# Altium footprint library GyokuRe.PcbLib: 1248 footprints (part 46 of 78)
Each footprint in its own frame and in the unit in brackets; x right, y up, seen from the top. Pads: shape width x height; smd on the part's side, far side on the other; paste and mask are expansions set on the pad; w line width, h text height; cw(c..) or ccw(c..) is an arc to the next point about the centre after c.
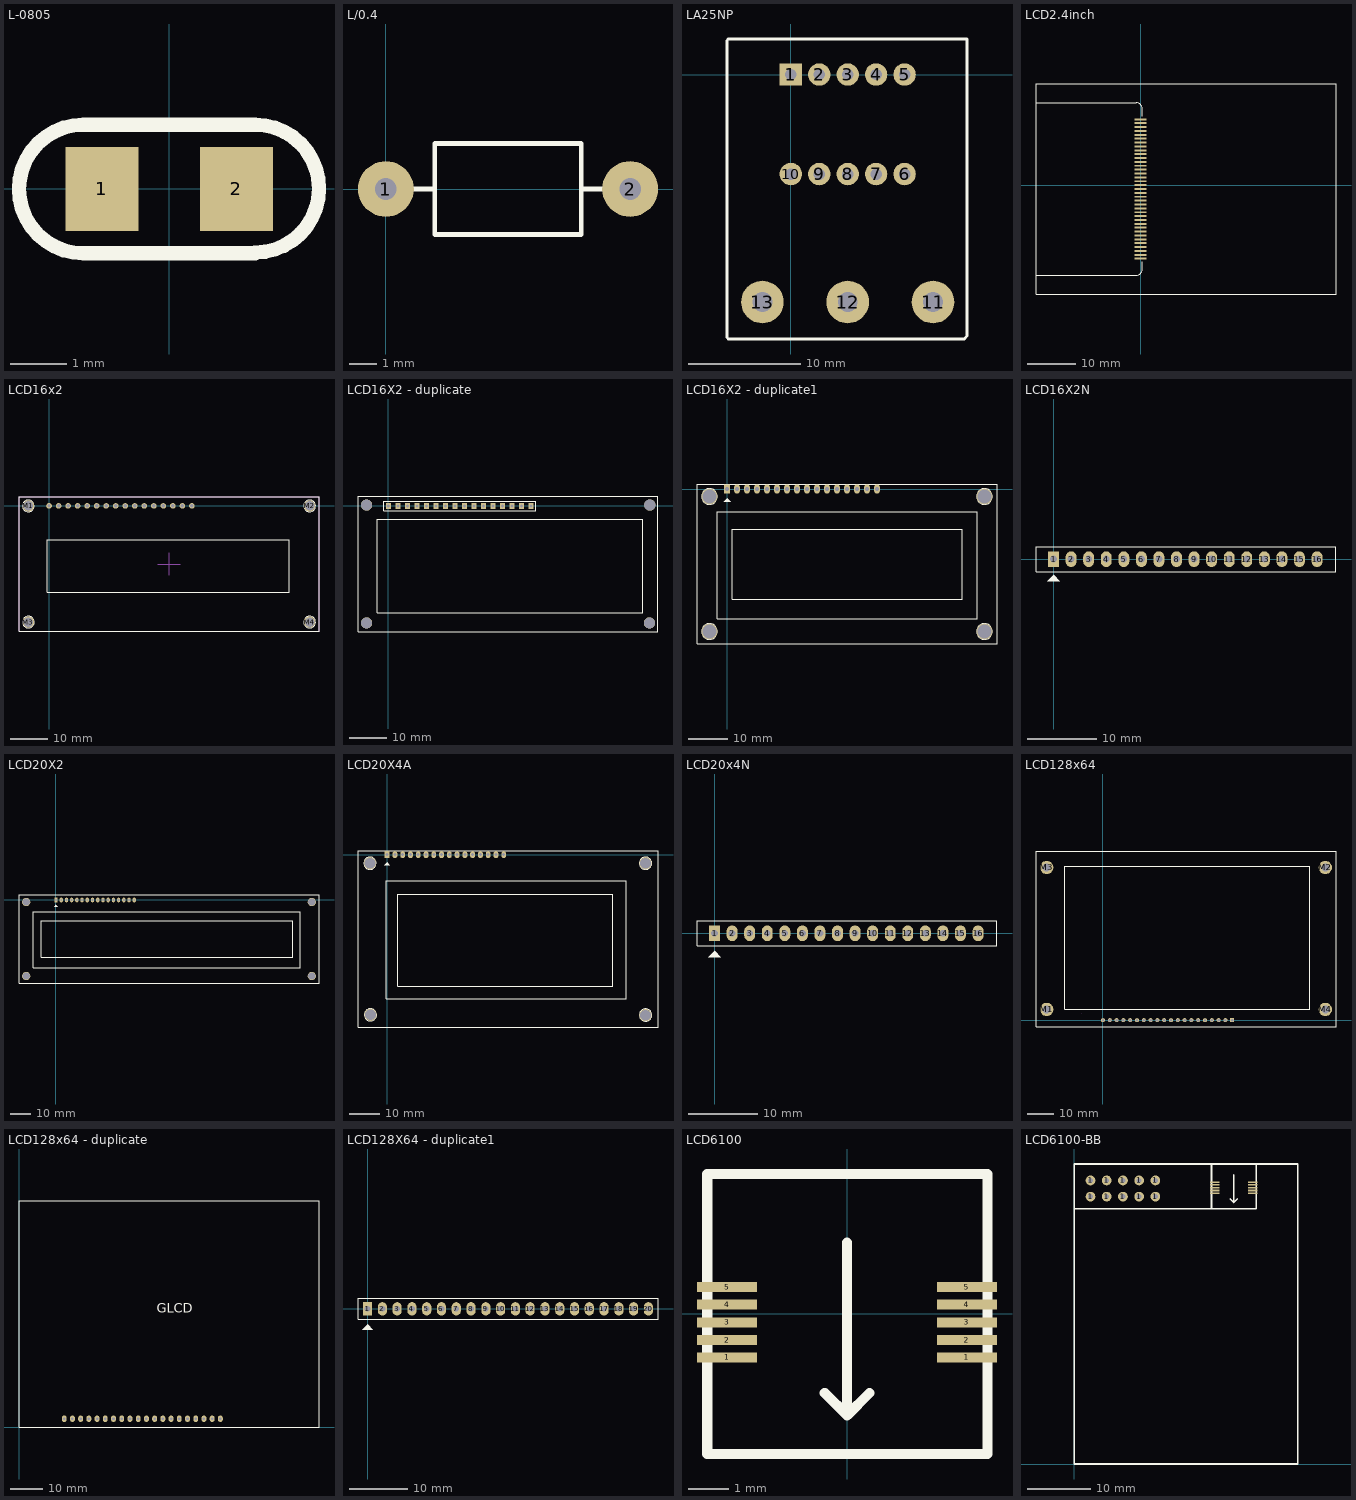
[diagram p45: the footprints below, top view; thin cyan lines are the x and y axes]

## L-0805 [mm] "Chip Inductor; Body 2.0 x 1.3 mm (LxW typ) [2012]"
height 0.65
pads (2):
  rect 1.3x1.5 smd: 1(-1.194,0) 2(1.194,0)
Top Overlay:
  lines w0.254: 1.524,-1.143 -1.524,-1.143 cw(c-1.524,0) -1.524,1.143 1.524,1.143 cw(c1.524,0.007) 1.524,-1.129
3D body "User Library-Chip Inductor.STEP": height 0.78, standoff -0.02, extent -0.8,-0.467 0.8,0.483

## L/0.4 [mil] "Inductor , 2 Pin, L 350mil, W 150 mil"
height 150
pads (2):
  round 80 hole 31: 1(0,0) 2(350,0)
Top Overlay:
  lines w7: 70,0 40,0 70,0 ; 70,0 70,-65 280,-65 280,0 ; 70,0 70,65 280,65 280,0 ; 280,0 310,0 280,0

## LA25NP [mm] "Current sensor 25A"
pads (13):
  rect 2x2 hole 1.016: 1(0,0)
  round 2 hole 1.016: 2(2.54,0) 3(5.08,0) 4(7.62,0) 5(10.16,0) 6(10.16,-8.89) 7(7.62,-8.89) 8(5.08,-8.89) 9(2.54,-8.89) 10(0,-8.89)
  round 3.81 hole 1.778: 11(12.7,-20.32) 12(5.08,-20.32) 13(-2.54,-20.32)
Top Overlay:
  lines w0.254: -5.715,-23.495 -5.715,3.048 -5.588,3.175 15.748,3.175 15.748,-23.368 15.494,-23.622 -5.588,-23.622
3D body: height 25.4, standoff 0, extent -6.604,-24.638 17.145,4.064

## LCD2.4inch [mm] "www.wandisplay.com - KWH024Q04"
pads (37):
  rect 2.5x0.4 smd: 0(-0.044,-15.206) 1(-0.044,-14.406) 2(-0.044,-13.606) 3(-0.044,-12.806) 4(-0.044,-12.006) 5(-0.044,-11.206) 6(-0.044,-10.406) 7(-0.044,-9.606) 8(-0.044,-8.806) 9(-0.044,-8.006) 10(-0.044,-7.206) 11(-0.044,-6.406) 12(-0.044,-5.606) 13(-0.044,-4.806) 14(-0.044,-4.006) 15(-0.044,-3.206) 16(-0.044,-2.406) 17(-0.044,-1.606) 18(-0.044,-0.806) 19(-0.044,-0.006) 20(-0.044,0.794) 21(-0.044,1.594) 22(-0.044,2.394) 23(-0.044,3.194) 24(-0.044,3.994) 25(-0.044,4.794) 26(-0.044,5.594) 27(-0.044,6.394) 28(-0.044,7.194) 29(-0.044,7.994) 30(-0.044,8.794) 31(-0.044,9.594) 32(-0.044,10.394) 33(-0.044,11.194) 34(-0.044,11.994) 35(-0.044,12.794) 36(-0.044,13.594)
Top Overlay:
  lines w0.254: -21.644,-18.606 -0.914,-18.606 ccw(c-0.914,-17.336) 0.356,-17.336 0.356,-15.806 0.356,-16.136 ; -21.644,16.994 -0.914,16.994 cw(c-0.914,15.724) 0.356,15.724 0.356,14.194 ; -21.644,-22.606 40.356,-22.606 40.356,20.994 -21.644,20.994 -21.644,-22.606

## LCD16x2 [mm] "Character LCD 16x2"
pads (20):
  round 1.5 hole 0.9: 1(0,0) 2(2.54,0) 3(5.08,0) 4(7.62,0) 5(10.16,0) 6(12.7,0) 7(15.24,0) 8(17.78,0) 9(20.32,0) 10(22.86,0) 11(25.4,0) 12(27.94,0) 13(30.48,0) 14(33.02,0) 15(35.56,0) 16(38.1,0)
  round 3 hole 2.5 unplated: M1(-5.5,0) M2(69.5,0) M3(-5.5,-31) M4(69.5,-31)
Top Overlay:
  circle w0.254: c-5.525,0 r1.57
  circle w0.254: c69.5,0 r1.57
  circle w0.254: c69.5,-31 r1.57
  circle w0.254: c-5.5,-31 r1.57
  lines w0.2: -8,-33.5 -8,2.5 72,2.5 72,-33.5 -8,-33.5 ; -0.5,-23 -0.5,-9 64,-9 64,-23 -0.5,-23
Bottom Overlay:
  circle w0.254: c-5.5,0.025 r1.57
  circle w0.254: c-5.5,-30.975 r1.57
  circle w0.254: c69.5,-30.975 r1.57
  circle w0.254: c69.5,0.025 r1.57
Mechanical 13:
  lines w0.2: -8.012,-33.5 -8.012,2.5 -8,2.5 72,2.5 72,-33.5 -8.012,-33.5
Mechanical 15:
  lines w0.254: 29,-15.5 35,-15.5 ; 32,-18.5 32,-12.5
3D body: height 8.83, standoff 8.05, extent 67.775,-1.75 71.275,1.75
3D body: height 8.83, standoff 8.05, extent 67.284,-2.261 71.784,2.239
3D body: height 8.83, standoff 8.05, extent 67.775,-32.75 71.275,-29.25
3D body: height 8.83, standoff 8.05, extent 67.284,-33.261 71.784,-28.761
3D body: height 8.83, standoff 8.05, extent -7.225,-32.75 -3.725,-29.25
3D body: height 8.83, standoff 8.05, extent -7.716,-33.261 -3.216,-28.761
3D body: height 8.83, standoff 8.05, extent -7.225,-1.75 -3.725,1.75
3D body: height 8.83, standoff 8.05, extent -7.716,-2.261 -3.216,2.239
3D body: height 8.89, standoff 4.83, extent -0.5,-23 64,-9
3D body: height 8.83, standoff 8.05, extent -0.85,-0.85 0.85,0.85
3D body: height 8.83, standoff 8.05, extent -0.5,-0.5 0.5,0.5
3D body: height 8.83, standoff 8.05, extent -0.857,0 0.857,2.45
3D body: height 8.83, standoff 8.05, extent 1.683,0 3.397,2.45
3D body: height 8.83, standoff 8.05, extent 2.04,-0.5 3.04,0.5
3D body: height 8.83, standoff 8.05, extent 1.69,-0.85 3.39,0.85
3D body: height 8.83, standoff 8.05, extent 4.223,0 5.937,2.45
3D body: height 8.83, standoff 8.05, extent 4.58,-0.5 5.58,0.5
3D body: height 8.83, standoff 8.05, extent 4.23,-0.85 5.93,0.85
3D body: height 8.83, standoff 8.05, extent 6.763,0 8.477,2.45
3D body: height 8.83, standoff 8.05, extent 7.12,-0.5 8.12,0.5
3D body: height 8.83, standoff 8.05, extent 6.77,-0.85 8.47,0.85
3D body: height 8.83, standoff 8.05, extent 9.303,0 11.017,2.45
3D body: height 8.83, standoff 8.05, extent 9.66,-0.5 10.66,0.5
3D body: height 8.83, standoff 8.05, extent 9.31,-0.85 11.01,0.85
3D body: height 8.83, standoff 8.05, extent 11.843,0 13.557,2.45
3D body: height 8.83, standoff 8.05, extent 12.2,-0.5 13.2,0.5
3D body: height 8.83, standoff 8.05, extent 11.85,-0.85 13.55,0.85
3D body: height 8.83, standoff 8.05, extent 14.383,0 16.097,2.45
3D body: height 8.83, standoff 8.05, extent 14.74,-0.5 15.74,0.5
3D body: height 8.83, standoff 8.05, extent 14.39,-0.85 16.09,0.85
3D body: height 8.83, standoff 8.05, extent 16.923,0 18.637,2.45
3D body: height 8.83, standoff 8.05, extent 17.28,-0.5 18.28,0.5
3D body: height 8.83, standoff 8.05, extent 16.93,-0.85 18.63,0.85
3D body: height 8.83, standoff 8.05, extent 19.463,0 21.177,2.45
3D body: height 8.83, standoff 8.05, extent 19.82,-0.5 20.82,0.5
3D body: height 8.83, standoff 8.05, extent 19.47,-0.85 21.17,0.85
3D body: height 8.83, standoff 8.05, extent 22.003,0 23.717,2.45
3D body: height 8.83, standoff 8.05, extent 22.36,-0.5 23.36,0.5
3D body: height 8.83, standoff 8.05, extent 22.01,-0.85 23.71,0.85
3D body: height 8.83, standoff 8.05, extent 24.543,0 26.257,2.45
3D body: height 8.83, standoff 8.05, extent 24.9,-0.5 25.9,0.5
3D body: height 8.83, standoff 8.05, extent 24.55,-0.85 26.25,0.85
3D body: height 8.83, standoff 8.05, extent 27.083,0 28.797,2.45
3D body: height 8.83, standoff 8.05, extent 27.44,-0.5 28.44,0.5
3D body: height 8.83, standoff 8.05, extent 27.09,-0.85 28.79,0.85
3D body: height 8.83, standoff 8.05, extent 29.623,0 31.337,2.45
3D body: height 8.83, standoff 8.05, extent 29.98,-0.5 30.98,0.5
3D body: height 8.83, standoff 8.05, extent 29.63,-0.85 31.33,0.85
3D body: height 8.83, standoff 8.05, extent 32.163,0 33.877,2.45
3D body: height 8.83, standoff 8.05, extent 32.52,-0.5 33.52,0.5
3D body: height 8.83, standoff 8.05, extent 32.17,-0.85 33.87,0.85
3D body: height 8.83, standoff 8.05, extent 34.703,0 36.417,2.45
3D body: height 8.83, standoff 8.05, extent 35.06,-0.5 36.06,0.5
3D body: height 8.83, standoff 8.05, extent 34.71,-0.85 36.41,0.85
3D body: height 8.83, standoff 8.05, extent 37.243,0 38.957,2.45
3D body: height 8.83, standoff 8.05, extent 37.6,-0.5 38.6,0.5
3D body: height 8.83, standoff 8.05, extent 37.25,-0.85 38.95,0.85
3D body: height 8.06, standoff 0, extent -7.752,-2.252 -3.248,2.252
3D body: height 8.06, standoff 0, extent -7.752,-33.252 -3.248,-28.748
3D body: height 8.06, standoff 0, extent 67.248,-33.252 71.752,-28.748
3D body: height 8.06, standoff 0, extent 67.248,-2.252 71.752,2.252
3D body: height 14.16, standoff 4.83, extent -2.5,-27.5 33,-3
3D body: height 14.16, standoff 4.83, extent 30.5,-27.5 66,-3
3D body: height 8.83, standoff 8.06, extent -8.012,-33.5 72,2.5

## LCD16X2 - duplicate [mm] "LCD 16x2"
pads (20):
  rect 1.3x1.6 hole 0.9: 1(0,0) 2(2.54,0) 3(5.08,0) 4(7.62,0) 5(10.16,0) 6(12.7,0) 7(15.24,0) 8(17.78,0) 9(20.32,0) 10(22.86,0) 11(25.4,0) 12(27.94,0) 13(30.48,0) 14(33.02,0) 15(35.56,0) 16(38.1,0)
  round 3 hole 3: ""(-5.842,-31.242) ""(69.723,-31.242)
  round 3 hole 3 paste+0 mask+0: ""(-5.842,0.254) ""(69.825,0.254)
Top Overlay:
  lines w0.2: -1.27,-1.27 39.37,-1.27 39.37,1.27 0.635,1.27 -1.27,1.27 -1.27,-1.27
  lines w0.254: 71.882,-33.528 -8.128,-33.528 -8.128,2.54 71.882,2.54 ; 72.009,-33.528 72.009,2.54 ; -3.001,-28.528 -3.001,-3.528 67.999,-3.528 67.999,-28.528 -3.001,-28.528
3D body: height 1.5, standoff 0, extent 8.89,-1.27 11.43,1.27
3D body: height 7, standoff -1, extent 9.754,-0.406 10.55,0.392
3D body: height 1.5, standoff 0, extent 6.35,-1.27 8.89,1.27
3D body: height 7, standoff -1, extent 7.214,-0.406 8.01,0.392
3D body: height 1.5, standoff 0, extent 3.81,-1.27 6.35,1.27
3D body: height 7, standoff -1, extent 4.674,-0.406 5.47,0.392
3D body: height 1.5, standoff 0, extent 1.27,-1.27 3.81,1.27
3D body: height 7, standoff -1, extent 2.134,-0.406 2.93,0.392
3D body: height 1.5, standoff 0, extent -1.27,-1.27 1.27,1.27
3D body: height 7, standoff -1, extent -0.406,-0.406 0.39,0.392
3D body: height 1.5, standoff 0, extent 21.59,-1.27 24.13,1.27
3D body: height 7, standoff -1, extent 22.454,-0.406 23.25,0.392
3D body: height 1.5, standoff 0, extent 19.05,-1.27 21.59,1.27
3D body: height 7, standoff -1, extent 19.914,-0.406 20.71,0.392
3D body: height 1.5, standoff 0, extent 16.51,-1.27 19.05,1.27
3D body: height 7, standoff -1, extent 17.374,-0.406 18.17,0.392
3D body: height 1.5, standoff 0, extent 13.97,-1.27 16.51,1.27
3D body: height 7, standoff -1, extent 14.834,-0.406 15.63,0.392
3D body: height 1.5, standoff 0, extent 11.43,-1.27 13.97,1.27
3D body: height 7, standoff -1, extent 12.294,-0.406 13.09,0.392
3D body: height 1.5, standoff 0, extent 34.29,-1.27 36.83,1.27
3D body: height 7, standoff -1, extent 35.154,-0.406 35.95,0.392
3D body: height 1.5, standoff 0, extent 31.75,-1.27 34.29,1.27
3D body: height 7, standoff -1, extent 32.614,-0.406 33.41,0.392
3D body: height 1.5, standoff 0, extent 29.21,-1.27 31.75,1.27
3D body: height 7, standoff -1, extent 30.074,-0.406 30.87,0.392
3D body: height 1.5, standoff 0, extent 26.67,-1.27 29.21,1.27
3D body: height 7, standoff -1, extent 27.534,-0.406 28.33,0.392
3D body: height 1.5, standoff 0, extent 24.13,-1.27 26.67,1.27
3D body: height 7, standoff -1, extent 24.994,-0.406 25.79,0.392
3D body: height 1.5, standoff 0, extent 36.83,-1.27 39.37,1.27
3D body: height 7, standoff -1, extent 37.694,-0.406 38.49,0.392
3D body "User Library-LCD16x02.step": height 19, standoff 5.1, extent -8,-33.5 72,2.5

## LCD16X2 - duplicate1 [mil] "LCD dipslay 16x2, 16 pin"
height 400
pads (20):
  rect 62x90 hole 36: 1(0,0)
  oval 62x90 hole 36: 2(100,0) 3(200,0) 4(300,0) 5(400,0) 6(500,0) 7(600,0) 8(700,0) 9(800,0) 10(900,0) 11(1000,0) 12(1100,0) 13(1200,0) 14(1300,0) 15(1400,0) 16(1500,0)
  round 157.48 hole 137.8: "Hole 0"(-175,-1425) "Hole 0"(-175,-75) "Hole 0"(2575,-1425) "Hole 0"(2575,-75)
Top Overlay:
  circle w7: c2575,-1425 r79.06
  circle w7: c2575,-75 r79.06
  circle w7: c-175,-75 r79.06
  circle w7: c-175,-1425 r79.06
  region: 0,-90 -35,-125 35,-125
  lines w7: -300,-1550 -300,50 2700,50 2700,-1550 -300,-1550 ; -100,-1300 -100,-225 2500,-225 2500,-1300 -100,-1300 ; 50,-1100 50,-400 2350,-400 2350,-1100 50,-1100
3D body "LCD module 16 X 2 backlight.STEP": height 414, standoff -106, extent -314.65,-1360 2854.65,77.01

## LCD16X2N [mil] "LCD dipslay 16x2, 16 pin"
height 400
pads (16):
  rect 62x90 hole 39: 1(0,0)
  oval 62x90 hole 39: 2(100,0) 3(200,0) 4(300,0) 5(400,0) 6(500,0) 7(600,0) 8(700,0) 9(800,0) 10(900,0) 11(1000,0) 12(1100,0) 13(1200,0) 14(1300,0) 15(1400,0) 16(1500,0)
Top Overlay:
  region: 0,-90 -35,-125 35,-125
  lines w7: -100,-71 -100,70 1608,70 1608,-71 -100,-71
3D body "socket16.stp": height 276.19, standoff -117.51, extent -50,-44.99 1550,55.01
3D body "jp16.stp": height 468.11, standoff -20.08, extent -48.03,-48.43 1548.03,50
3D body "lcd16.STEP": height 764, standoff 244, extent -319.64,-1353.49 2849.65,83.51

## LCD20X2 [mil] "LCD dipslay 20x2, 16 pin"
height 400
pads (20):
  rect 62x90 hole 36: 1(0,0)
  oval 62x90 hole 36: 2(100,0) 3(200,0) 4(300,0) 5(400,0) 6(500,0) 7(600,0) 8(700,0) 9(800,0) 10(900,0) 11(1000,0) 12(1100,0) 13(1200,0) 14(1300,0) 15(1400,0) 16(1500,0)
  round 157.48 hole 137.8: "Hole 0"(-570.87,-1456.69) "Hole 0"(-570.87,-39.37) "Hole 0"(4901.57,-1456.69) "Hole 0"(4901.57,-39.37)
Top Overlay:
  region: 0,-90 -35,-125 35,-125
  lines w7: -708.66,-1594.49 -708.66,100 5039.37,100 5039.37,-1594.49 -708.66,-1594.49 ; -436,-1300 -436,-225 4682,-225 4682,-1300 -436,-1300 ; -286,-1100 -286,-400 4532,-400 4532,-1100 -286,-1100
3D body "SW3dPS-Display20x2.STEP": height 198, standoff -180, extent -100,-1437 4470,33

## LCD20X4A [mil] "LCD dipslay 20x4, 16 pin"
height 400
pads (20):
  rect 62x90 hole 39: 1(0,0)
  oval 62x90 hole 39: 2(100,0) 3(200,0) 4(300,0) 5(400,0) 6(500,0) 7(600,0) 8(700,0) 9(800,0) 10(900,0) 11(1000,0) 12(1100,0) 13(1200,0) 14(1300,0) 15(1400,0) 16(1500,0)
  round 157.48 hole 137.8: "Hole 0"(-220,-110) "Hole 0"(-215,-2060) "Hole 0"(3325,-2065) "Hole 0"(3325,-110)
Top Overlay:
  circle w7: c-215.06,-2061 r79.06
  circle w7: c-221.06,-110 r79.06
  circle w7: c3324.94,-110 r79.06
  circle w7: c3324.94,-2063 r79.06
  region: 0,-100 -35,-135 35,-135
  lines w7: -375,-2220 -375,50 3485,50 3485,-2220 -374,-2220 ; -11,-1852 3076,-1852 3076,-337 -11,-337 -11,-1852 ; 139,-1695 2905,-1695 2905,-512 139,-512 139,-1695
3D body "User Library-LCD20_4.STEP": height 417.32, standoff -125.98, extent -392.13,-2264.2 3466.13,98

## LCD20x4N [mil] "LCD dipslay 20x4, 16 pin"
height 400
pads (16):
  rect 62x90 hole 39: 1(0,0)
  oval 62x90 hole 39: 2(100,0) 3(200,0) 4(300,0) 5(400,0) 6(500,0) 7(600,0) 8(700,0) 9(800,0) 10(900,0) 11(1000,0) 12(1100,0) 13(1200,0) 14(1300,0) 15(1400,0) 16(1500,0)
Top Overlay:
  region: 0,-100 -35,-135 35,-135
  lines w7: -100,-71 -100,70 1608,70 1608,-71 -100,-71
3D body "User Library-LCD20_4.STEP": height 417.32, standoff -125.98, extent -392,-2265.2 3466.27,97

## LCD128x64 [mm] "Graphic LCD 128x64"
pads (24):
  rect 1.5x1.5 hole 0.9: 1(48.26,0)
  round 1.5 hole 0.9: 2(45.72,0) 3(43.18,0) 4(40.64,0) 5(38.1,0) 6(35.56,0) 7(33.02,0) 8(30.48,0) 9(27.94,0) 10(25.4,0) 11(22.86,0) 12(20.32,0) 13(17.78,0) 14(15.24,0) 15(12.7,0) 16(10.16,0) 17(7.62,0) 18(5.08,0) 19(2.54,0) 20(0,0)
  round 5 hole 3 unplated: M1(-21,4) M2(83,57) M3(-21,57) M4(83,4)
Top Overlay:
  lines w0.2: -25,-2.4 -25,63 87,63 87,-2.4 -25,-2.4 ; -14.2,4 -14.2,57.5 77.2,57.5 77.2,4 -14.2,4
Mechanical 13:
  lines w0.2: -8.012,2.5 -8,2.5
3D body: height 4.83, standoff 4.06, extent -25,-2.367 87,63.1
3D body: height 10.16, standoff 4.83, extent -14.1,4 32.4,57.4
3D body: height 10.16, standoff 4.83, extent 31.9,4 77.35,57.3
3D body: height 4.83, standoff 4.05, extent 47.41,-0.85 49.11,0.85
3D body: height 4.83, standoff 4.05, extent 44.87,-0.85 46.57,0.85
3D body: height 4.83, standoff 4.05, extent 42.33,-0.85 44.03,0.85
3D body: height 4.83, standoff 4.05, extent 39.79,-0.85 41.49,0.85
3D body: height 4.83, standoff 4.05, extent 47.403,-2.3 49.117,0.15
3D body: height 4.83, standoff 4.05, extent 44.863,-2.3 46.577,0.15
3D body: height 4.83, standoff 4.05, extent 42.323,-2.3 44.037,0.15
3D body: height 4.83, standoff 4.05, extent 39.783,-2.3 41.497,0.15
3D body: height 4.83, standoff 4.05, extent -0.815,-2.425 0.9,0.025
3D body: height 8.89, standoff 4.83, extent -7.5,10.3 70.8,51.2
3D body: height 4.83, standoff 4.05, extent -0.85,-0.85 0.85,0.85
3D body: height 4.83, standoff 4.05, extent -0.5,-0.5 0.5,0.5
3D body: height 4.83, standoff 4.05, extent 1.683,-2.45 3.397,0
3D body: height 4.83, standoff 4.05, extent 2.04,-0.5 3.04,0.5
3D body: height 4.83, standoff 4.05, extent 1.69,-0.85 3.39,0.85
3D body: height 4.83, standoff 4.05, extent 4.223,-2.45 5.937,0
3D body: height 4.83, standoff 4.05, extent 4.58,-0.5 5.58,0.5
3D body: height 4.83, standoff 4.05, extent 4.23,-0.85 5.93,0.85
3D body: height 4.83, standoff 4.05, extent 6.763,-2.45 8.477,0
3D body: height 4.83, standoff 4.05, extent 7.12,-0.5 8.12,0.5
3D body: height 4.83, standoff 4.05, extent 6.77,-0.85 8.47,0.85
3D body: height 4.83, standoff 4.05, extent 9.303,-2.45 11.017,0
3D body: height 4.83, standoff 4.05, extent 9.66,-0.5 10.66,0.5
3D body: height 4.83, standoff 4.05, extent 9.31,-0.85 11.01,0.85
3D body: height 4.83, standoff 4.05, extent 11.843,-2.45 13.557,0
3D body: height 4.83, standoff 4.05, extent 12.2,-0.5 13.2,0.5
3D body: height 4.83, standoff 4.05, extent 11.85,-0.85 13.55,0.85
3D body: height 4.83, standoff 4.05, extent 14.383,-2.45 16.097,0
3D body: height 4.83, standoff 4.05, extent 14.74,-0.5 15.74,0.5
3D body: height 4.83, standoff 4.05, extent 14.39,-0.85 16.09,0.85
3D body: height 4.83, standoff 4.05, extent 16.923,-2.45 18.637,0
3D body: height 4.83, standoff 4.05, extent 17.28,-0.5 18.28,0.5
3D body: height 4.83, standoff 4.05, extent 16.93,-0.85 18.63,0.85
3D body: height 4.83, standoff 4.05, extent 19.463,-2.45 21.177,0
3D body: height 4.83, standoff 4.05, extent 19.82,-0.5 20.82,0.5
3D body: height 4.83, standoff 4.05, extent 19.47,-0.85 21.17,0.85
3D body: height 4.83, standoff 4.05, extent 22.003,-2.45 23.717,0
3D body: height 4.83, standoff 4.05, extent 22.36,-0.5 23.36,0.5
3D body: height 4.83, standoff 4.05, extent 22.01,-0.85 23.71,0.85
3D body: height 4.83, standoff 4.05, extent 24.543,-2.45 26.257,0
3D body: height 4.83, standoff 4.05, extent 24.9,-0.5 25.9,0.5
3D body: height 4.83, standoff 4.05, extent 24.55,-0.85 26.25,0.85
3D body: height 4.83, standoff 4.05, extent 27.083,-2.45 28.797,0
3D body: height 4.83, standoff 4.05, extent 27.44,-0.5 28.44,0.5
3D body: height 4.83, standoff 4.05, extent 27.09,-0.85 28.79,0.85
3D body: height 4.83, standoff 4.05, extent 29.623,-2.45 31.337,0
3D body: height 4.83, standoff 4.05, extent 29.98,-0.5 30.98,0.5
3D body: height 4.83, standoff 4.05, extent 29.63,-0.85 31.33,0.85
3D body: height 4.83, standoff 4.05, extent 32.163,-2.45 33.877,0
3D body: height 4.83, standoff 4.05, extent 32.52,-0.5 33.52,0.5
3D body: height 4.83, standoff 4.05, extent 32.17,-0.85 33.87,0.85
3D body: height 4.83, standoff 4.05, extent 34.703,-2.45 36.417,0
3D body: height 4.83, standoff 4.05, extent 35.06,-0.5 36.06,0.5
3D body: height 4.83, standoff 4.05, extent 34.71,-0.85 36.41,0.85
3D body: height 4.83, standoff 4.05, extent 37.243,-2.45 38.957,0
3D body: height 4.83, standoff 4.05, extent 37.6,-0.5 38.6,0.5
3D body: height 4.83, standoff 4.05, extent 37.25,-0.85 38.95,0.85

## LCD128x64 - duplicate [mm]
pads (20):
  oval 1.5x2 hole 0.8: 1(62.23,2.54) 2(59.69,2.54) 3(57.15,2.54) 4(54.61,2.54) 5(52.07,2.54) 6(49.53,2.54) 7(46.99,2.54) 8(44.45,2.54) 9(41.91,2.54) 10(39.37,2.54) 11(36.83,2.54) 12(34.29,2.54) 13(31.75,2.54) 14(29.21,2.54) 15(26.67,2.54) 16(24.13,2.54) 17(21.59,2.54) 18(19.05,2.54) 19(16.51,2.54) 20(13.97,2.54)
Top Overlay:
  lines w0.15: 0,0 0,69.85 92.71,69.85 92.71,0 0,0
  text "GLCD" at 42.545,34.163 h5
3D body "User Library-GRAPHIC LCD WG12864B.step": height 15.4, standoff 0, extent -2.27,1.04 77.73,55.04

## LCD128X64 - duplicate1 [mil] "LCD Graphic 128x64, 20 pin"
height 400
pads (20):
  rect 62x90 hole 39: 1(0,0)
  oval 62x90 hole 39: 2(100,0) 3(200,0) 4(300,0) 5(400,0) 6(500,0) 7(600,0) 8(700,0) 9(800,0) 10(900,0) 11(1000,0) 12(1100,0) 13(1200,0) 14(1300,0) 15(1400,0) 16(1500,0) 17(1600,0) 18(1700,0) 19(1800,0) 20(1900,0)
Top Overlay:
  region: 0,-105 -35,-140 35,-140
  lines w7: -65,-71 -65,70 1965,70 1965,-71 -65,-71
3D body "User Library-GRAPHIC LCD WG12864B.STEP": height 475.59, standoff -130.71, extent -612.8,-2069.98 2536.8,56

## LCD6100 [mm]
pads (10):
  rect 1.5x0.25 smd: 1(-3,-1.091) 1(2.994,-1.091) 2(-3,-0.66) 2(2.994,-0.66) 3(-3,-0.215) 3(2.994,-0.215) 4(-3,0.229) 4(2.994,0.229) 5(-3,0.661) 5(2.994,0.661)
Top Overlay:
  lines w0.254: -0.559,-1.981 0,-2.54 ; 0,1.778 0,-2.54 ; 0.559,-1.981 0,-2.54 ; -3.493,-3.507 -3.493,3.493 3.507,3.493 3.507,-3.507 -3.493,-3.507

## LCD6100-BB [mil]
pads (20):
  round 60 hole 30: 1(100,1649) 1(100,1749) 1(200,1649) 1(200,1749) 1(300,1649) 1(300,1749) 1(400,1649) 1(400,1749) 1(500,1649) 1(500,1749)
  rect 59.06x9.84 smd: 1(865.83,1669.92) 1(1101.83,1669.92) 2(865.83,1686.92) 2(1101.83,1686.92) 3(865.83,1704.42) 3(1101.83,1704.42) 4(865.83,1721.92) 4(1101.83,1721.92) 5(865.83,1738.92) 5(1101.83,1738.92)
Top Overlay:
  lines w10: 0,0 1377.95,0 1377.95,1849.39 ; 0,1 0,1850.39 1377.95,1850.39 ; 0,1574.8 1122.05,1574.8 ; 961.96,1634.89 983.96,1612.89 ; 983.96,1782.89 983.96,1612.89 ; 1005.96,1634.89 983.96,1612.89 ; 1122.05,1574.8 1122.05,1850.39 846.46,1850.39 846.46,1574.8 1122.05,1574.8